# Altium footprint library PCB元件库.PcbLib: 17 footprints (part 2 of 2)
Each footprint in its own frame and in the unit in brackets; x right, y up, seen from the top. Pads: shape width x height; smd on the part's side, far side on the other; paste and mask are expansions set on the pad; w line width, h text height; cw(c..) or ccw(c..) is an arc to the next point about the centre after c.
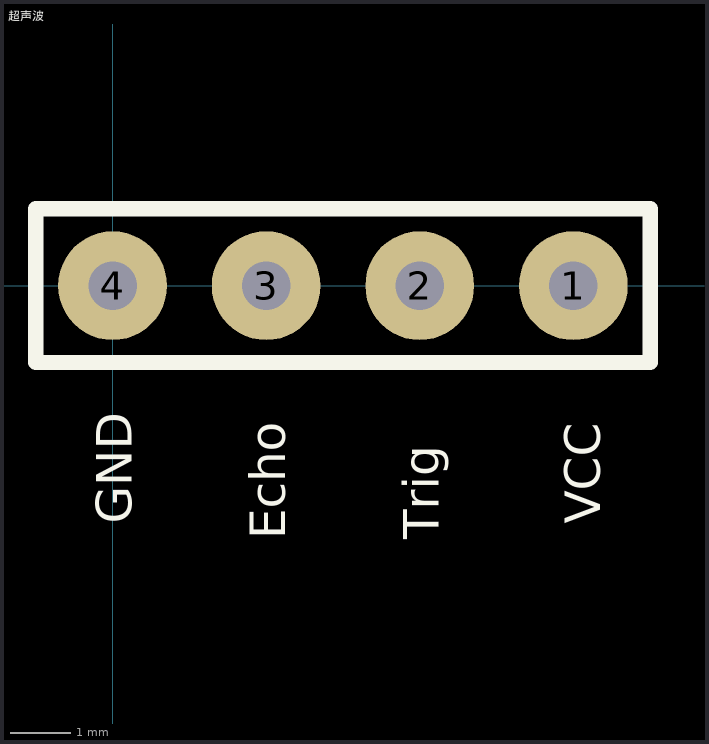
[diagram p1: the footprint, top view; thin cyan lines are the x and y axes]

## 超声波 [mm]
pads (4):
  round 1.8 hole 0.8: 1(7.62,0) 2(5.08,0) 3(2.54,0) 4(0,0)
Top Overlay:
  lines w0.254: -1.27,-1.27 -1.27,1.27 8.89,1.27 8.89,-1.27 -1.27,-1.27
  text "GND" at 0.508,-3.937 h1
  text "Echo" at 3.048,-4.191 h1
  text "Trig" at 5.588,-4.191 h1
  text "VCC" at 8.255,-3.937 h1